# Altium footprint library microbuilder.PCBLIB: 422 footprints (part 9 of 27)
Each footprint in its own frame and in the unit in brackets; x right, y up, seen from the top. Pads: shape width x height; smd on the part's side, far side on the other; paste and mask are expansions set on the pad; w line width, h text height; cw(c..) or ccw(c..) is an arc to the next point about the centre after c.
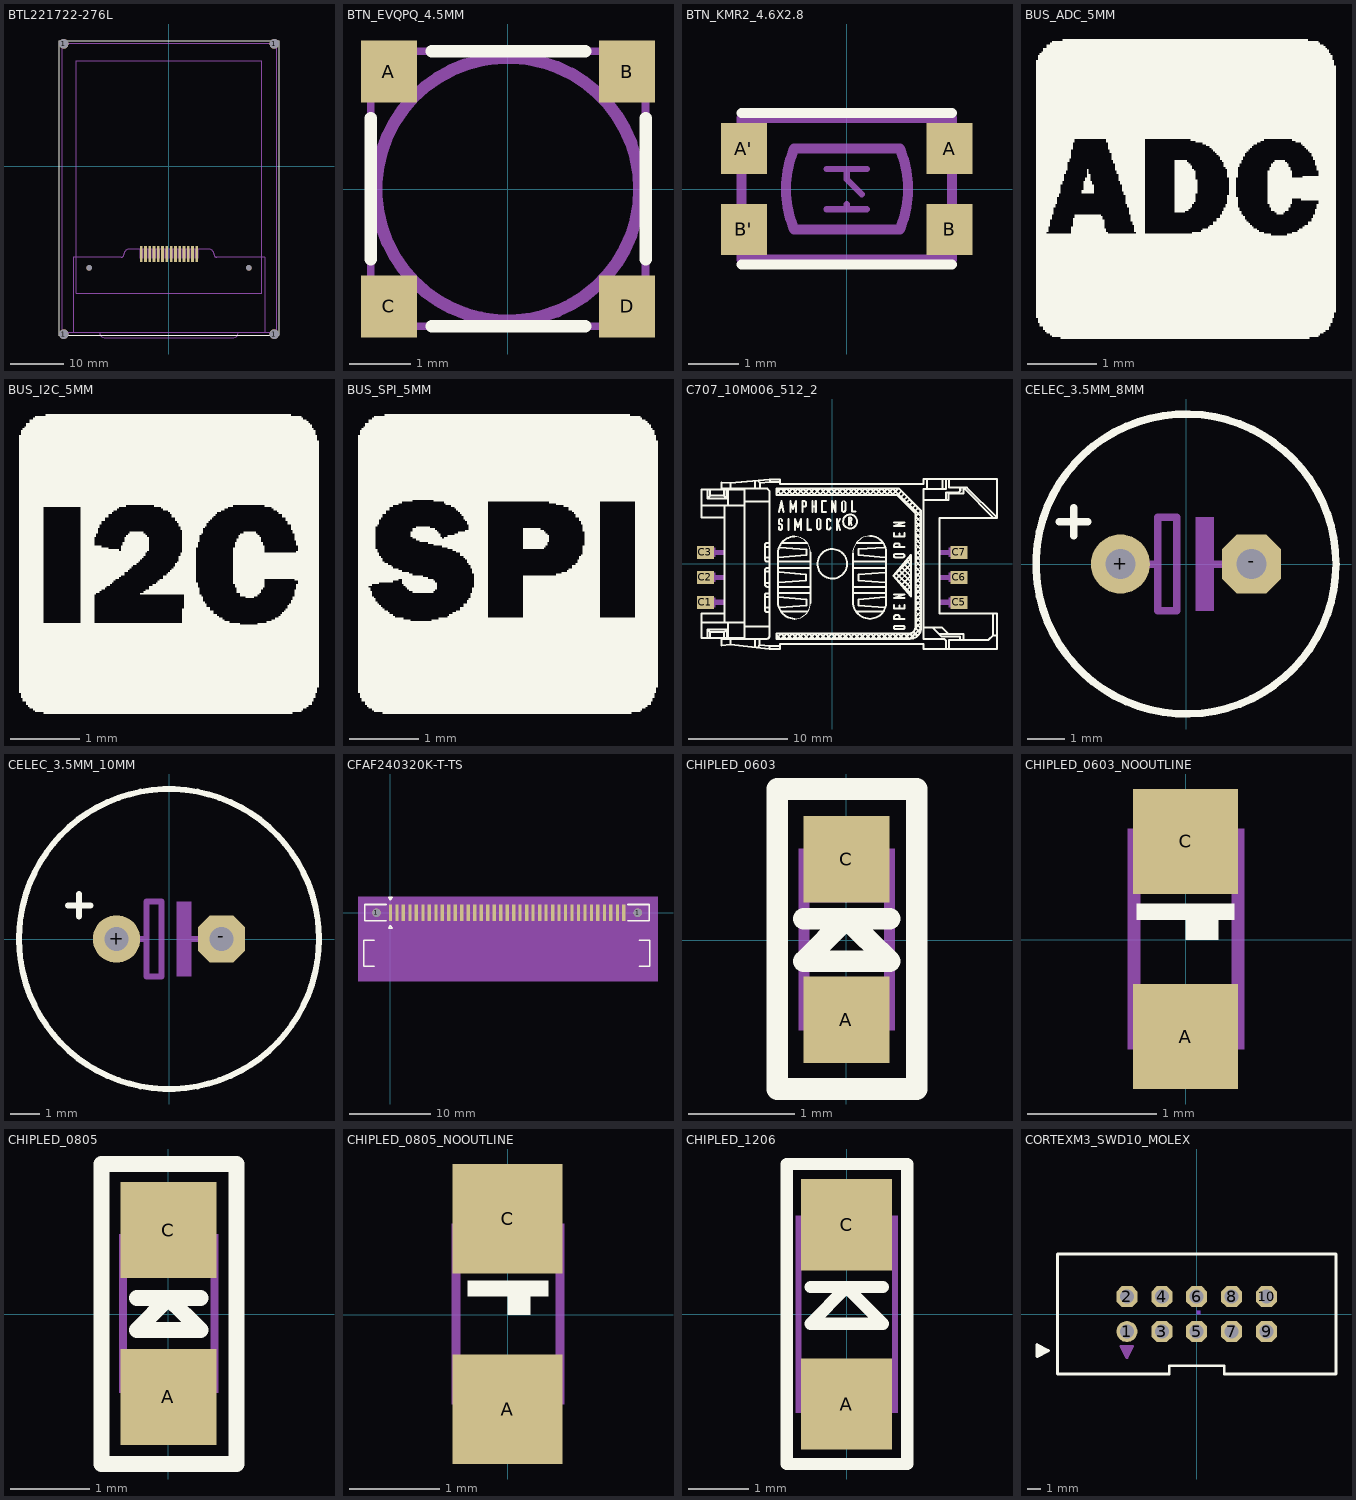
[diagram p8: the footprints below, top view; thin cyan lines are the x and y axes]

## BTL221722-276L [mil]
pads (20):
  round 71 hole 71: 1(-777.56,-1240.16) 1(-777.56,906) 1(778,-1240.16) 1(778,906)
  round 40 hole 40: 1(-590.55,-750.39) 1(591,-750.39)
  rect 20x119 smd: 1(-204.72,-647.24) 2(-173.23,-647.24) 3(-141.73,-647.24) 4(-110.24,-647.24) 5(-78.74,-647.24) 6(-47.24,-647.24) 7(-15.75,-647.24) 8(16,-647.24) 9(48,-647.24) 10(79,-647.24) 11(111,-647.24) 12(142,-647.24) 13(174,-647.24) 14(205,-647.24)
Top Overlay:
  lines w8: -812.99,-1246.46 -812.99,930 813,930 813,-1246.46 -812.99,-1246.46
Mechanical 16:
  drawing of 174 lines, arcs and shapes, not listed
  text "1.0mm max buldge" at -177.17,-1220.47 h37.2
  text "1" at -275.59,-708.66 h77.5
  text "14" at 237,-708.66 h77.5

## BTN_EVQPQ_4.5MM [mil]
pads (4):
  rect 36x40 smd: A(-76.77,76) B(77,76) C(-76.77,-75.79) D(77,-75.79)
Top Overlay:
  lines w8: -88.58,-45.28 -88.58,46 ; -49.21,-88.58 50,-88.58 ; -49.21,89 50,89 ; 89,-45.28 89,46
Mechanical 16:
  circle w8: c0,0 r85
  lines w5: -88.58,-88.58 89,-88.58 89,89 -88.58,89 -88.58,-88.58

## BTN_KMR2_4.6X2.8 [mil]
pads (4):
  rect 36x40 smd: A(81,32) A'(-80.71,32) B(81,-31.5) B'(-80.71,-31.5)
Top Overlay:
  lines w8: -82.68,-59.06 83,-59.06 ; -82.68,60 83,60
Mechanical 13:
  lines w5: -15.75,-15.75 0,-15.75 ; -15.75,16 0,16 ; 0,-11.81 0,-15.75 ; 12,-3.94 0,8 0,16 ; 16,-15.75 0,-15.75 ; 16,16 0,16
Mechanical 16:
  lines w8: -82.68,-55.12 83,-55.12 83,56 -82.68,56 -82.68,-55.12 ; -41.34,-31.5 cw(c35.31,0.25) -41.34,32 42,32 cw(c-34.65,0.25) 42,-31.5 -41.34,-31.5

## BUS_ADC_5MM [mil]
Top Overlay:
  drawing of 615 lines, arcs and shapes, not listed

## BUS_I2C_5MM [mil]
Top Overlay:
  drawing of 618 lines, arcs and shapes, not listed

## BUS_SPI_5MM [mil]
Top Overlay:
  drawing of 603 lines, arcs and shapes, not listed

## C707_10M006_512_2 [mil]
pads (6):
  rect 67x52 smd: C1(-505.91,-154.13) C2(-505.91,-54.13) C3(-505.91,46) C5(506,-154.13) C6(506,-54.13) C7(506,46)
Top Overlay:
  drawing of 486 lines, arcs and shapes, not listed
Mechanical 16:
  rectangle: -466.58,36 -429.37,56
  rectangle: -520.96,-72.99 -465.15,-34.35
  rectangle: -466.58,-64.41 -429.37,-44.37
  rectangle: -520.96,-173.18 -465.15,-134.54
  rectangle: -466.58,-164.59 -429.37,-143.12
  rectangle: 428,-164.59 466,-143.12
  rectangle: 464,-173.18 520,-134.54
  rectangle: 428,-64.41 466,-44.37
  rectangle: 464,-72.99 520,-34.35
  rectangle: 428,36 466,56
  rectangle: 464,28 520,65
  rectangle: -520.96,28 -465.15,66

## CELEC_3.5MM_8MM [mil]
pads (2):
  round 63 hole 32: +(-70,0)
  oct 63x63 hole 32: -(70,0)
Top Overlay:
  circle w8: c0,0 r160
  lines w8: -135,45 -105,45 ; -120,30 -120,60
Mechanical 16:
  rectangle: 10,-50 30,50
  lines w8: -65,0 -30,0 ; 25,0 65,0 ; -30,0 -30,-50 -10,-50 -10,50 -30,50 -30,0

## CELEC_3.5MM_10MM [mil]
pads (2):
  round 63 hole 32: +(-70,0)
  oct 63x63 hole 32: -(70,0)
Top Overlay:
  circle w8: c0,0 r200
  lines w8: -135,45 -105,45 ; -120,30 -120,60
Mechanical 16:
  rectangle: 10,-50 30,50
  lines w8: -65,0 -30,0 ; 25,0 65,0 ; -30,0 -30,-50 -10,-50 -10,50 -30,50 -30,0

## CFAF240320K-T-TS [mil]
pads (39):
  round 40 hole 40: 1(-67.91,0) 1(1202,0)
  rect 16x79 smd: P$1(0,0) P$2(32,0) P$3(63,0) P$4(95,0) P$5(126,0) P$6(158,0) P$7(189,0) P$8(221,0) P$9(252,0) P$10(284,0) P$11(315,0) P$12(347,0) P$13(378,0) P$14(410,0) P$15(441,0) P$16(473,0) P$17(504,0) P$18(536,0) P$19(567,0) P$20(599,0) P$21(630,0) P$22(662,0) P$23(693,0) P$24(725,0) P$25(756,0) P$26(788,0) P$27(819,0) P$28(851,0) P$29(882,0) P$30(914,0) P$31(945,0) P$32(977,0) P$33(1008,0) P$34(1040,0) P$35(1071,0) P$36(1103,0) P$37(1134,0)
Top Overlay:
  lines w8: -78.74,-259.84 -129.92,-259.84 -129.92,-133.86 -78.74,-133.86 ; -19.68,-39.37 -124.02,-39.37 -124.02,40 -19.68,40 ; 1154,-39.37 1258,-39.37 1258,40 1154,40 ; 1209,-259.84 1260,-259.84 1260,-133.86 1209,-133.86 ; -7.87,-74.8 0,-62.99 8,-74.8 -7.87,-74.8 ; -7.87,75 8,75 0,63 -7.87,75
Mechanical 16:
  circle w8: c-66.93,0 r24
  circle w8: c1201,0 r24
  rectangle: -7.87,-39.37 8,40
  rectangle: 24,-39.37 40,40
  rectangle: 56,-39.37 71,40
  rectangle: 87,-39.37 103,40
  rectangle: 119,-39.37 134,40
  rectangle: 150,-39.37 166,40
  rectangle: 182,-39.37 197,40
  rectangle: 213,-39.37 229,40
  rectangle: 245,-39.37 260,40
  rectangle: 276,-39.37 292,40
  rectangle: 308,-39.37 323,40
  rectangle: 339,-39.37 355,40
  rectangle: 371,-39.37 386,40
  rectangle: 402,-39.37 418,40
  rectangle: 434,-39.37 449,40
  rectangle: 465,-39.37 481,40
  rectangle: 497,-39.37 512,40
  rectangle: 528,-39.37 544,40
  rectangle: 560,-39.37 575,40
  rectangle: 591,-39.37 607,40
  rectangle: 623,-39.37 638,40
  rectangle: 654,-39.37 670,40
  rectangle: 686,-39.37 701,40
  rectangle: 717,-39.37 733,40
  rectangle: 749,-39.37 764,40
  rectangle: 780,-39.37 796,40
  rectangle: 812,-39.37 827,40
  rectangle: 843,-39.37 859,40
  rectangle: 875,-39.37 890,40
  rectangle: 906,-39.37 922,40
  rectangle: 938,-39.37 953,40
  rectangle: 969,-39.37 985,40
  rectangle: 1000,-39.37 1016,40
  rectangle: 1032,-39.37 1048,40
  rectangle: 1063,-39.37 1079,40
  rectangle: 1095,-39.37 1111,40
  rectangle: 1126,-39.37 1142,40
  rectangle: -125.98,-255.91 1256,-137.8
  lines w8: -125.98,-39.37 1260,-39.37 1260,40 -125.98,40 -125.98,-39.37 ; -7.87,-74.8 0,-62.99 8,-74.8 -7.87,-74.8
Mechanical 27:
  rectangle: -157.48,-334.65 1300,79

## CHIPLED_0603 [mil]
pads (2):
  rect 32x32 smd: A(0,-29.53) C(0,30)
Top Overlay:
  lines w8: -15.75,8 0,8 ; 16,8 0,8 ; 0,8 -15.75,-7.87 16,-7.87 0,8 ; -25.59,-55.12 -25.59,56 26,56 26,-55.12 -25.59,-55.12
Mechanical 16:
  circle w2: c-13.78,25 r3
  rectangle: -17.72,28 -9.84,34
  rectangle: -10.83,22 -8.86,24
  rectangle: -17.72,14 -15.75,29
  rectangle: 10,22 18,34
  rectangle: -17.72,14 18,23
  rectangle: -17.72,-33.46 -9.84,-13.78
  rectangle: 10,-33.46 18,-13.78
  rectangle: -10.83,-22.64 11,-13.78
  rectangle: -10.83,-25.59 -6.89,-21.65
  rectangle: 7,-25.59 11,-21.65
  lines w2: -10.83,-32.48 cw(c0.09,-32.48) 11,-32.48
  lines w4: -15.75,-13.78 -15.75,15 ; -11.81,32 ccw(c0.09,33.04) 12,32 ; 16,-13.78 16,14

## CHIPLED_0603_NOOUTLINE [mil]
pads (2):
  rect 32x32 smd: A(0,-29.53) C(0,30)
Top Overlay:
  rectangle: -15,6 15,11
  region: 0,0 10,0 10,10 0,10
Mechanical 16:
  circle w2: c-13.78,25 r3
  rectangle: -17.72,28 -9.84,34
  rectangle: -10.83,22 -8.86,24
  rectangle: -17.72,14 -15.75,29
  rectangle: 10,22 18,34
  rectangle: -17.72,14 18,23
  rectangle: -17.72,-33.46 -9.84,-13.78
  rectangle: 10,-33.46 18,-13.78
  rectangle: -10.83,-22.64 11,-13.78
  rectangle: -10.83,-25.59 -6.89,-21.65
  rectangle: 7,-25.59 11,-21.65
  lines w2: -10.83,-32.48 cw(c0.09,-32.48) 11,-32.48
  lines w4: -15.75,-13.78 -15.75,15 ; -11.81,32 ccw(c0.09,33.04) 12,32 ; 16,-13.78 16,14

## CHIPLED_0805 [mil]
pads (2):
  rect 48x48 smd: A(0,-41.34) C(0,42)
Top Overlay:
  lines w8: -15.75,8 0,8 ; 16,8 0,8 ; 0,8 -15.75,-7.87 16,-7.87 0,8 ; -33.46,-74.8 34,-74.8 34,75 -33.46,75 -33.46,-74.8
Mechanical 16:
  circle w3: c-17.72,34 r5
  rectangle: 12,20 25,40
  rectangle: -12.8,20 -6.89,30
  rectangle: 7,20 13,30
  rectangle: -7.87,20 8,27
  rectangle: 12,-39.37 25,-19.68
  rectangle: -24.61,-39.37 -11.81,-19.68
  rectangle: 7,-29.53 13,-19.68
  rectangle: -12.8,-29.53 -6.89,-19.68
  rectangle: -7.87,-26.57 8,-19.68
  rectangle: -23.62,20 -11.81,30
  rectangle: -24.61,37 -11.81,40
  lines w4: -22.64,-19.68 -22.64,37 ; -13.78,-36.42 cw(c0.11,-38.57) 14,-36.42 ; -13.78,37 ccw(c0.11,39.15) 14,37 ; 23,-20.67 23,21
  text "A" at -3.94,-55.12 h15.5
  text "C" at -3.94,48 h15.5

## CHIPLED_0805_NOOUTLINE [mil]
pads (2):
  rect 48x48 smd: A(0,-41.34) C(0,42)
Top Overlay:
  rectangle: -17.5,8 18,15
  region: 0,0 10,0 10,10 0,10
Mechanical 16:
  circle w3: c-17.72,34 r5
  rectangle: 12,20 25,40
  rectangle: -12.8,20 -6.89,30
  rectangle: 7,20 13,30
  rectangle: -7.87,20 8,27
  rectangle: 12,-39.37 25,-19.68
  rectangle: -24.61,-39.37 -11.81,-19.68
  rectangle: 7,-29.53 13,-19.68
  rectangle: -12.8,-29.53 -6.89,-19.68
  rectangle: -7.87,-26.57 8,-19.68
  rectangle: -23.62,20 -11.81,30
  rectangle: -24.61,37 -11.81,40
  lines w4: -22.64,-19.68 -22.64,37 ; -13.78,-36.42 cw(c0.11,-38.57) 14,-36.42 ; -13.78,37 ccw(c0.11,39.15) 14,37 ; 23,-20.67 23,21
  text "A" at -3.94,-55.12 h15.5
  text "C" at -3.94,48 h15.5

## CHIPLED_1206 [mil]
pads (2):
  rect 60x60 smd: A(0,-58.9) C(0,59)
Top Overlay:
  lines w8: -23.62,18 0,18 ; 24,18 0,18 ; 0,18 -23.62,-6.06 24,-6.06 0,18 ; -39.37,-98.37 -39.37,99 40,99 40,-98.37 -39.37,-98.37
Mechanical 16:
  circle w3: c-21.65,57 r4
  rectangle: -33.46,61 -13.78,65
  rectangle: -33.46,49 -24.61,62
  rectangle: -17.72,49 -12.8,58
  rectangle: -25.59,49 -8.86,54
  rectangle: 14,52 34,65
  rectangle: 10,49 34,54
  rectangle: -33.46,38 34,50
  rectangle: -33.46,-64.96 34,-37.4
  lines w4: -31.5,-37.4 -31.5,38 ; -15.75,63 ccw(c0.13,64.02) 16,63 ; 32,-37.4 32,38
  text "A" at -3.94,-87.8 h24.8
  text "C" at -3.94,74 h24.8

## CORTEXM3_SWD10_MOLEX [mil]
pads (10):
  round 60 hole 40: 1(-200,-50)
  oct 60x60 hole 40: 2(-200,50) 3(-100,-50) 4(-100,50) 5(0,-50) 6(0,50) 7(100,-50) 8(100,50) 9(200,-50) 10(200,50)
Top Layer keep-out:
  region: 0,0 10,0 10,10 0,10
  region: 0,0 10,0 10,10 0,10
  region: 0,0 10,0 10,10 0,10
  region: 0,0 10,0 10,10 0,10
  region: 0,0 10,0 10,10 0,10
  region: 0,0 10,0 10,10 0,10
  region: 0,0 10,0 10,10 0,10
  region: 0,0 10,0 10,10 0,10
  region: 0,0 10,0 10,10 0,10
  region: 0,0 10,0 10,10 0,10
  region: 0,0 10,0 10,10 0,10
  region: 0,0 10,0 10,10 0,10
Bottom Layer keep-out:
  region: 0,0 10,0 10,10 0,10
  region: 0,0 10,0 10,10 0,10
  region: 0,0 10,0 10,10 0,10
  region: 0,0 10,0 10,10 0,10
  region: 0,0 10,0 10,10 0,10
  region: 0,0 10,0 10,10 0,10
  region: 0,0 10,0 10,10 0,10
  region: 0,0 10,0 10,10 0,10
  region: 0,0 10,0 10,10 0,10
  region: 0,0 10,0 10,10 0,10
  region: 0,0 10,0 10,10 0,10
  region: 0,0 10,0 10,10 0,10
Top Overlay:
  region: -440.37,-114.37 -440.37,-94.37 -450.37,-94.37 -450.37,-114.37
  region: -450.37,-119.37 -450.37,-104.37 -455.37,-104.37 -455.37,-119.37
  region: -450.37,-104.37 -450.37,-89.37 -455.37,-89.37 -455.37,-104.37
  region: -432.37,-109.37 -432.37,-99.37 -442.37,-99.37 -442.37,-109.37
  lines w8: -434.37,-104.37 -424.37,-104.37 ; -424.37,-104.37 -457.37,-87.37 -457.37,-121.37 -424.37,-104.37 ; -398.62,-171.26 -398.62,172 399,172 399,-171.26 79,-171.26 79,-147.64 -78.74,-147.64 -78.74,-171.26 -398.62,-171.26
Mechanical 16:
  rectangle: -210,-109 -190,-99
  rectangle: -215,-99 -200,-94
  rectangle: -200,-99 -185,-94
  rectangle: -205,-117 -195,-107
  lines w8: -200,-115 -200,-125 ; -200,-125 -183,-92 -217,-92 -200,-125
  text "1" at -285.43,-78.74 h77.5